# Altium schematic symbol library AD_Lib.SchLib: 1239 symbols (part 8 of 9)
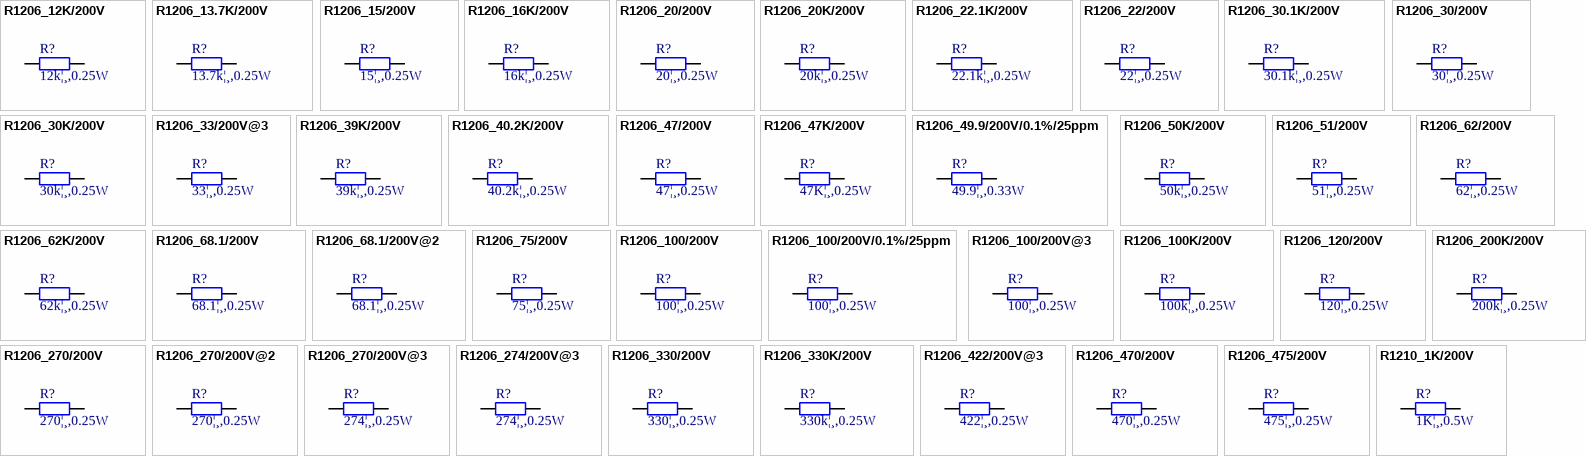
[diagram p49: symbols R1206_12K/200V to R1210_1K/200V]

## R1206_100K/200V
designator R?, comment 100k¦¸,0.25W
ÌùÆ¬µç×è; Manufacturer: KOA; pro-environment: RoHS; Quality: -55~155¡æ; other: 100k¦¸,0.25W,1%,200V; OPN: RK73H2BTTD1003F; PadsNum: 2; SN: SN; Category: µç×è; Part: RK73H2BTTD1003F; Value: 100k¦¸,0.25W; QTY: 5000; Price: ?; OPN_JLC: 1206W4F1003T5E; SN_JLC: C17900; Price_JLC: 0
footprint R1206 (¹«ÖÆ3216£»Ó¢ÖÆ1206£»¹¦ÂÊ1/4W)
pins: 1, 2

## R1206_120/200V
designator R?, comment 120¦¸,0.25W
ÌùÆ¬µç×è; Manufacturer: KOA; pro-environment: RoHS; Quality: -55~155¡æ; other: 120¦¸,0.25W,1%,200V; OPN: RK73H2BTTD1200F; PadsNum: 2; SN: SN; Category: µç×è; Part: RK73H2BTTD1200F; Value: 120¦¸,0.25W; QTY: 5000; Price: 0.04633; OPN_JLC: RC1206FR-07120RL; SN_JLC: C114928; Price_JLC: 0.032654
footprint R1206 (¹«ÖÆ3216£»Ó¢ÖÆ1206£»)
pins: 1, 2

## R1206_200K/200V
designator R?, comment 200k¦¸,0.25W
ÌùÆ¬µç×è; Manufacturer: KOA; pro-environment: RoHS; Quality: -55~155¡æ; other: 200k¦¸,0.25W,1%,200V; OPN: RK73H2BTTD2001F; PadsNum: 2; SN: SN; Category: µç×è; Part: RK73H2BTTD2001F; Value: 200k¦¸,0.25W; QTY: 5000; Price: 0.04563; OPN_JLC: OPN_JLC; SN_JLC: SN_JLC; Price_JLC: 0
footprint R1206 (¹«ÖÆ3216£»Ó¢ÖÆ1206£»¹¦ÂÊ1/4W)
pins: 1, 2

## R1206_270/200V
designator R?, comment 270¦¸,0.25W
ÌùÆ¬µç×è; Manufacturer: KOA; pro-environment: RoHS; Quality: -55~155¡æ; other: 270¦¸,0.25W,1%,200V; OPN: RK73H2BTTD2700F; PadsNum: 2; SN: SN; Category: µç×è; Part: RK73H2BTTD2700F; Value: 270¦¸,0.25W; QTY: 270; Price: ?; OPN_JLC: OPN_JLC; SN_JLC: SN_JLC; Price_JLC: 0
footprint R1206 (¹«ÖÆ3216£»Ó¢ÖÆ1206£»¹¦ÂÊ1/4W)
pins: 1, 2

## R1206_270/200V@2
designator R?, comment 270¦¸,0.25W
ÌùÆ¬µç×è; Manufacturer: Panasonic; pro-environment: RoHS; Quality: -55~155¡æ; other: 270¦¸,0.25W,1%,200V; OPN: ERJ-8ENF2700V; PadsNum: 2; SN: SN; Category: µç×è; Part: ERJ-8ENF2700V; Value: 270¦¸,0.25W; Price: ?; OPN_JLC: OPN_JLC; SN_JLC: SN_JLC; Price_JLC: 0
footprint R1206 (¹«ÖÆ3216£»Ó¢ÖÆ1206£»¹¦ÂÊ1/4W)
pins: 1, 2

## R1206_270/200V@3
designator R?, comment 274¦¸,0.25W
ÌùÆ¬µç×è; Manufacturer: Yageo; pro-environment: RoHS; Quality: -55~155¡æ; other: 274¦¸,0.25W,1%,200V; OPN: RC1206FR-07274R; PadsNum: 2; SN: SN; Category: µç×è; Part: RC1206FR-07274R; Value: 274¦¸,0.25W; QTY: 5000; Price: 0.03042; OPN_JLC: OPN_JLC; SN_JLC: SN_JLC; Price_JLC: 0
footprint R1206 (¹«ÖÆ3216£»Ó¢ÖÆ1206£»¹¦ÂÊ1/4W)
pins: 1, 2

## R1206_274/200V@3
designator R?, comment 274¦¸,0.25W
ÌùÆ¬µç×è; Manufacturer: Yageo; pro-environment: RoHS; Quality: -55~155¡æ; other: 274¦¸,0.25W,1%,200V; OPN: RC1206FR-07274R; PadsNum: 2; SN: SN; Category: µç×è; Part: RC1206FR-07274R; Value: 274¦¸,0.25W; QTY: 5000; Price: ?; OPN_JLC: OPN_JLC; SN_JLC: SN_JLC; Price_JLC: 0
footprint R1206 (¹«ÖÆ3216£»Ó¢ÖÆ1206£»)
pins: 1, 2

## R1206_330/200V
designator R?, comment 330¦¸,0.25W
ÌùÆ¬µç×è; Manufacturer: KOA; pro-environment: RoHS; Quality: -55~155¡æ; other: 330¦¸,0.25W,1%,200V; OPN: RK73H2BTTD3300F; PadsNum: 2; SN: SN; Category: µç×è; Part: RK73H2BTTD3300F; Value: 330¦¸,0.25W; QTY: 5000; Price: ?; OPN_JLC: OPN_JLC; SN_JLC: SN_JLC; Price_JLC: 0
footprint R1206 (¹«ÖÆ3216£»Ó¢ÖÆ1206£»¹¦ÂÊ1/4W)
pins: 1, 2

## R1206_330K/200V
designator R?, comment 330k¦¸,0.25W
ÌùÆ¬µç×è; Manufacturer: KOA; pro-environment: RoHS; Quality: -55~155¡æ; SN: 03.4.38.11.18033402S; other: 330k¦¸,0.25W,1%,200V; OPN: RK73H2BTTD3303F; PadsNum: 2; Category: µç×è; Part: RK73H2BTTD3303F; Value: 330k¦¸,0.25W; QTY: 5000; Price: 0.05031; OPN_JLC: OPN_JLC; SN_JLC: SN_JLC; Price_JLC: 0
footprint R1206 (¹«ÖÆ3216£»Ó¢ÖÆ1206£»¹¦ÂÊ1/4W)
pins: 1, 2

## R1206_422/200V@3
designator R?, comment 422¦¸,0.25W
ÌùÆ¬µç×è; Manufacturer: Yageo; pro-environment: RoHS; Quality: -55~155¡æ; SN: 03.4.38.11.18042101S; other: 422¦¸,0.25W,1%,200V; OPN: RC1206FR-07422RL; PadsNum: 2; Category: µç×è; Part: RC1206FR-07422RL; Value: 422¦¸,0.25W; QTY: 5000; Price: 0.03042; OPN_JLC: OPN_JLC; SN_JLC: SN_JLC; Price_JLC: 0
footprint R1206 (¹«ÖÆ3216£»Ó¢ÖÆ1206£»)
pins: 1, 2

## R1206_470/200V
designator R?, comment 470¦¸,0.25W
ÌùÆ¬µç×è; Manufacturer: KOA; pro-environment: RoHS; Quality: -55~155¡æ; SN: 03.4.38.11.18047103S; other: 470¦¸,0.25W,1%,200V; OPN: RK73H2BTTD4700F; PadsNum: 2; Category: µç×è; Part: RK73H2BTTD4700F; Value: 470¦¸,0.25W; QTY: 5000; Price: ?; OPN_JLC: OPN_JLC; SN_JLC: SN_JLC; Price_JLC: 0
footprint R1206 (¹«ÖÆ3216£»Ó¢ÖÆ1206£»)
pins: 1, 2

## R1206_475/200V
designator R?, comment 475¦¸,0.25W
ÌùÆ¬µç×è; Manufacturer: KOA; pro-environment: RoHS; Quality: -55~155¡æ; other: 475¦¸,0.25W,1%,200V; OPN: RK73H2BTTD4750F; PadsNum: 2; SN: SN; Category: µç×è; Part: RK73H2BTTD4750F; Value: 475¦¸,0.25W; QTY: 5000; Price: ?; OPN_JLC: OPN_JLC; SN_JLC: SN_JLC; Price_JLC: 0
footprint R1206 (¹«ÖÆ3216£»Ó¢ÖÆ1206£»¹¦ÂÊ1/4W)
pins: 1, 2

## R1210_1K/200V
designator R?, comment 1K¦¸,0.5W
ÌùÆ¬µç×è; Manufacturer: KOA; pro-environment: RoHS; Quality: -55~155¡æ; SN: 03.4.38.11.19010201S; other: 1K¦¸,0.5W,5%,200V; OPN: RK73H2ETTD1001F; PadsNum: 2; Category: µç×è; Part: RK73H2ETTD1001F; Value: 1K¦¸,0.5W; QTY: 5000; Price: 0.27495; OPN_JLC: OPN_JLC; SN_JLC: SN_JLC; Price_JLC: 0
footprint R1210 (¹«ÖÆ3225£»Ó¢ÖÆ1210£»¹¦ÂÊ1/3W)
pins: 1, 2

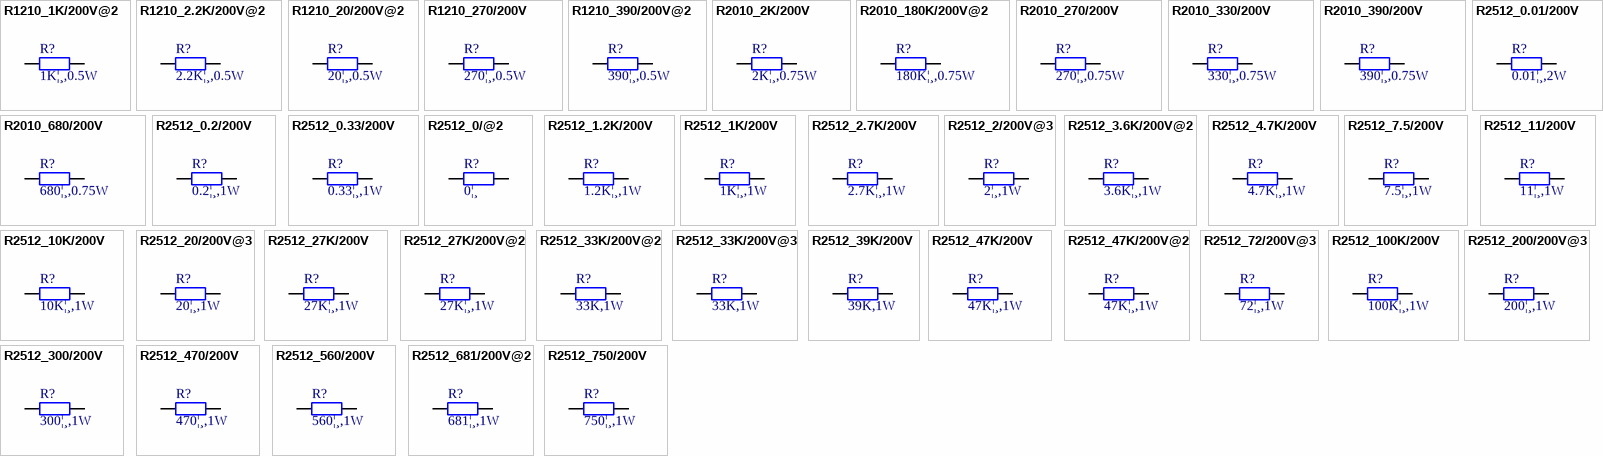
[diagram p35: symbols R1210_1K/200V@2 to R2512_750/200V]

## R1210_1K/200V@2
designator R?, comment 1K¦¸,0.5W
ÌùÆ¬µç×è; Manufacturer: Panasonic; pro-environment: RoHS; Quality: -55~155¡æ; other: 1K¦¸,0.5W,5%,200V; OPN: ERJ14YJ102U; PadsNum: 2; SN: SN; Category: µç×è; Part: ERJ14YJ102U; Value: 1K¦¸,0.5W; QTY: 5000; Price: 0.16965; OPN_JLC: OPN_JLC; SN_JLC: SN_JLC; Price_JLC: 0
footprint R1210 (¹«ÖÆ3225£»Ó¢ÖÆ1210£»¹¦ÂÊ1/3W)
pins: 1, 2

## R1210_2.2K/200V@2
designator R?, comment 2.2K¦¸,0.5W
ÌùÆ¬µç×è; Manufacturer: Panasonic; pro-environment: RoHS; Quality: -55~155¡æ; other: 2.2K¦¸,0.5W,5%,200V; OPN: ERJ-14YJ222U; PadsNum: 2; SN: SN; Category: µç×è; Part: ERJ-14YJ222U; Value: 2.2K¦¸,0.5W; QTY: 5000; Price: 0.16965; OPN_JLC: OPN_JLC; SN_JLC: SN_JLC; Price_JLC: 0
footprint R1210 (¹«ÖÆ3225£»Ó¢ÖÆ1210£»¹¦ÂÊ1/3W)
pins: 1, 2

## R1210_20/200V@2
designator R?, comment 20¦¸,0.5W
ÌùÆ¬µç×è; Manufacturer: Panasonic; pro-environment: RoHS; Quality: -55~155¡æ; other: 20¦¸,0.5W,5%,200V; OPN: ERJ14YJ200U; PadsNum: 2; SN: SN; Category: µç×è; Part: ERJ14YJ200U; Value: 20¦¸,0.5W; QTY: 5000; Price: 0.16965; OPN_JLC: OPN_JLC; SN_JLC: SN_JLC; Price_JLC: 0
footprint R1210 (¹«ÖÆ3225£»Ó¢ÖÆ1210£»¹¦ÂÊ1/3W)
pins: 1, 2

## R1210_270/200V
designator R?, comment 270¦¸,0.5W
ÌùÆ¬µç×è; Manufacturer: KOA; pro-environment: RoHS; Quality: -55~155¡æ; SN: 03.4.38.11.19027201S; other: 270¦¸,0.5W,5%,200V; OPN: RK73H2ETTD2700F; PadsNum: 2; Category: µç×è; Part: RK73H2ETTD2700F; Value: 270¦¸,0.5W; QTY: 5000; Price: 0.27495; OPN_JLC: OPN_JLC; SN_JLC: SN_JLC; Price_JLC: 0
footprint R1210 (¹«ÖÆ3225£»Ó¢ÖÆ1210£»¹¦ÂÊ1/3W)
pins: 1, 2

## R1210_390/200V@2
designator R?, comment 390¦¸,0.5W
ÌùÆ¬µç×è; Manufacturer: Panasonic; pro-environment: RoHS; Quality: -55~155¡æ; other: 390¦¸,0.5W,5%,200V; OPN: ERJ14YJ391U; PadsNum: 2; SN: SN; Category: µç×è; Part: ERJ14YJ391U; Value: 390¦¸,0.5W; QTY: 5000; Price: 0.16965; OPN_JLC: OPN_JLC; SN_JLC: SN_JLC; Price_JLC: 0
footprint R1210 (¹«ÖÆ3225£»Ó¢ÖÆ1210£»¹¦ÂÊ1/3W)
pins: 1, 2

## R2010_2K/200V
designator R?, comment 2K¦¸,0.75W
ÌùÆ¬µç×è; Manufacturer: KOA; pro-environment: RoHS; Quality: -55~155¡æ; other: 2K¦¸,0.75W,1%,200V; OPN: RK73HW2HTTE2001F; PadsNum: 2; SN: SN; Category: µç×è; Part: RK73HW2HTTE2001F; Value: 2K¦¸,0.75W; QTY: 4000; Price: 1.2051; OPN_JLC: OPN_JLC; SN_JLC: SN_JLC; Price_JLC: 0
footprint R2010 (Chip Resistor; Body 5.0 x 2.5 mm (LxW typ))
pins: 1, 2

## R2010_180K/200V@2
designator R?, comment 180K¦¸,0.75W
ÌùÆ¬µç×è; Manufacturer: Panasonic; pro-environment: RoHS; Quality: -55~155¡æ; other: 180K¦¸,0.75W,1%,200V; OPN: ERJ12YJ184U; PadsNum: 2; SN: SN; Category: µç×è; Part: ERJ12YJ184U; Value: 180K¦¸,0.75W; QTY: 4000; OPN_JLC: OPN_JLC; SN_JLC: SN_JLC; Price_JLC: 0
footprint R2010 (Chip Resistor; Body 5.0 x 2.5 mm (LxW typ))
pins: 1, 2

## R2010_270/200V
designator R?, comment 270¦¸,0.75W
ÌùÆ¬µç×è; Manufacturer: KOA; pro-environment: RoHS; Quality: -55~155¡æ; other: 270¦¸,0.75W,1%,200V; OPN: RK73HW2HTTE2700F; PadsNum: 2; SN: SN; Category: µç×è; Part: RK73HW2HTTE2700F; Value: 270¦¸,0.75W; QTY: 4000; OPN_JLC: OPN_JLC; SN_JLC: SN_JLC; Price_JLC: 0
footprint R2010 (Chip Resistor; Body 5.0 x 2.5 mm (LxW typ))
pins: 1, 2

## R2010_330/200V
designator R?, comment 330¦¸,0.75W
ÌùÆ¬µç×è; Manufacturer: KOA; pro-environment: RoHS; Quality: -55~155¡æ; other: 330¦¸,0.75W,1%,200V; OPN: RK73HW2HTTE3300F; PadsNum: 2; SN: SN; Category: µç×è; Part: RK73HW2HTTE3300F; Value: 330¦¸,0.75W; QTY: 4000; OPN_JLC: OPN_JLC; SN_JLC: SN_JLC; Price_JLC: 0
footprint R2010 (Chip Resistor; Body 5.0 x 2.5 mm (LxW typ))
pins: 1, 2

## R2010_390/200V
designator R?, comment 390¦¸,0.75W
ÌùÆ¬µç×è; Manufacturer: KOA; pro-environment: RoHS; Quality: -55~155¡æ; other: 390¦¸,0.75W,1%,200V; OPN: RK73HW2HRTTE3900F; PadsNum: 2; SN: SN; Category: µç×è; Part: RK73HW2HRTTE3900F; Value: 390¦¸,0.75W; QTY: 4000; Price: 1.2051; OPN_JLC: OPN_JLC; SN_JLC: SN_JLC; Price_JLC: 0
footprint R2010 (Chip Resistor; Body 5.0 x 2.5 mm (LxW typ))
pins: 1, 2

## R2010_680/200V
designator R?, comment 680¦¸,0.75W
ÌùÆ¬µç×è; Manufacturer: KOA; Part: 'RK73HW2HTTE6800F; pro-environment: RoHS; Quality: -55~155¡æ; other: 680¦¸,0.75W,1%,200V; OPN: RK73HW2HTTE6800F; PadsNum: 2; SN: SN; Category: µç×è; Value: 680¦¸,0.75W; QTY: 4000; OPN_JLC: OPN_JLC; SN_JLC: SN_JLC; Price_JLC: 0
footprint R2010 (Chip Resistor; Body 5.0 x 2.5 mm (LxW typ))
pins: 1, 2

## R2512_0.01/200V
designator R?, comment 0.01¦¸,2W
ÌùÆ¬µç×è£¬µçÁ÷²ÉÑù; Manufacturer: KOA; pro-environment: RoHS; Quality: -65~170¡æ; other: 0.01¦¸,1W,1%,200V,150ppm; OPN: TLR3AWDTE10L0F; PadsNum: 2; SN: SN; Category: µç×è; Part: TLR3AWDTE10L0F; Value: 0.01¦¸,2W; QTY: 2000; Price: 4.3056; OPN_JLC: OPN_JLC; SN_JLC: SN_JLC; Price_JLC: 0
footprint R2512 (¹«ÖÆ6432£»Ó¢ÖÆ2512£»¹¦ÂÊ1W)
pins: 1, 2

## R2512_0.2/200V
designator R?, comment 0.2¦¸,1W
ÌùÆ¬µç×è£¬µçÁ÷²ÉÑù; Manufacturer: KOA; pro-environment: RoHS; Quality: -55~180¡æ; other: 0.2¦¸,1W,1%,200V,100ppm; OPN: SL1TTER200F; PadsNum: 2; SN: SN; Category: µç×è; Part: SL1TTER200F; Value: 0.2¦¸,1W; QTY: 1000; Price: 3.5568; OPN_JLC: OPN_JLC; SN_JLC: SN_JLC; Price_JLC: 0
footprint R2512 (¹«ÖÆ6432£»Ó¢ÖÆ2512£»¹¦ÂÊ1W)
pins: 1, 2

## R2512_0.33/200V
designator R?, comment 0.33¦¸,1W
ÌùÆ¬µç×è£¬µçÁ÷²ÉÑù; Manufacturer: Yageo; pro-environment: RoHS; Quality: -55~125¡æ; SN: 03.4.38.11.22033001S; other: 0.33¦¸,1W,1%,200V,800ppm; OPN: RL2512FK-070R33L; PadsNum: 2; Category: µç×è; Part: RL2512FK-070R33L; Value: 0.33¦¸,1W; QTY: 4000; Price: 0.70317; OPN_JLC: OPN_JLC; SN_JLC: SN_JLC; Price_JLC: 0
footprint R2512 (¹«ÖÆ6432£»Ó¢ÖÆ2512£»¹¦ÂÊ1W)
pins: 1, 2

## R2512_0/@2
designator R?, comment 0¦¸
ÌùÆ¬µç×è; Manufacturer: Panasonic; pro-environment: RoHS; Quality: -55~155¡æ; SN: 03.4.38.11.22000001S; other: 0¦¸,1W,0.05%; OPN: ERJ1TY0R00U; PadsNum: 2; Category: µç×è; Part: ERJ1TY0R00U; Value: 0¦¸; QTY: 4000; Price: 0.46917; OPN_JLC: OPN_JLC; SN_JLC: SN_JLC; Price_JLC: 0
footprint R2512 (¹«ÖÆ6432£»Ó¢ÖÆ2512£»¹¦ÂÊ1W)
pins: 1, 2

## R2512_1.2K/200V
designator R?, comment 1.2K¦¸,1W
ÌùÆ¬µç×è; Manufacturer: KOA; pro-environment: RoHS; Quality: -55~155¡æ; other: 1.2K¦¸,1W,1%,200V; OPN: RK73HW3ATTE1201F; PadsNum: 2; SN: SN; Category: µç×è; Part: RK73HW3ATTE1201F; Value: 1.2K¦¸,1W; QTY: 4000; OPN_JLC: OPN_JLC; SN_JLC: SN_JLC; Price_JLC: 0
footprint R2512 (¹«ÖÆ6432£»Ó¢ÖÆ2512£»¹¦ÂÊ1W)
pins: 1, 2

## R2512_1K/200V
designator R?, comment 1K¦¸,1W
ÌùÆ¬µç×è; Manufacturer: KOA; pro-environment: RoHS; Quality: -55~155¡æ; other: 1K¦¸,1W,1%,200V; OPN: RK73HW3ATTE1001F; PadsNum: 2; SN: SN; Category: µç×è; Part: RK73HW3ATTE1001F; Value: 1K¦¸,1W; QTY: 4000; OPN_JLC: OPN_JLC; SN_JLC: SN_JLC; Price_JLC: 0
footprint R2512 (¹«ÖÆ6432£»Ó¢ÖÆ2512£»¹¦ÂÊ1W)
pins: 1, 2

## R2512_2.7K/200V
designator R?, comment 2.7K¦¸,1W
ÌùÆ¬µç×è; Manufacturer: KOA; pro-environment: RoHS; Quality: -55~155¡æ; other: 2.7K¦¸,1W,1%,200V; OPN: RK73HW3ARTTE2701F; PadsNum: 2; SN: SN; Category: µç×è; Part: RK73HW3ARTTE2701F; Value: 2.7K¦¸,1W; QTY: 4000; Price: 1.9656; OPN_JLC: OPN_JLC; SN_JLC: SN_JLC; Price_JLC: 0
footprint R2512 (¹«ÖÆ6432£»Ó¢ÖÆ2512£»¹¦ÂÊ1W)
pins: 1, 2

## R2512_2/200V@3
designator R?, comment 2¦¸,1W
ÌùÆ¬µç×è; Manufacturer: Yageo; pro-environment: RoHS; Quality: -55~155¡æ; other: 2¦¸,1W,5%,200V; OPN: RC2512JK-072RL; PadsNum: 2; SN: SN; Category: µç×è; Part: RC2512JK-072RL; Value: 2¦¸,1W; QTY: 4000; Price: 0.16146; OPN_JLC: OPN_JLC; SN_JLC: SN_JLC; Price_JLC: 0
footprint R2512 (¹«ÖÆ6432£»Ó¢ÖÆ2512£»¹¦ÂÊ1W)
pins: 1, 2

## R2512_3.6K/200V@2
designator R?, comment 3.6K¦¸,1W
ÌùÆ¬µç×è; Manufacturer: Panasonic; pro-environment: RoHS; Quality: -55~155¡æ; SN: 03.4.38.11.22036201S; other: 3.6K¦¸,1W,5%,200V; OPN: ERJ1TYJ362U; PadsNum: 2; Category: µç×è; Part: ERJ1TYJ362U; Value: 3.6K¦¸,1W; QTY: 4000; Price: 0.51714; OPN_JLC: OPN_JLC; SN_JLC: SN_JLC; Price_JLC: 0
footprint R2512 (¹«ÖÆ6432£»Ó¢ÖÆ2512£»¹¦ÂÊ1W)
pins: 1, 2

## R2512_4.7K/200V
designator R?, comment 4.7K¦¸,1W
ÌùÆ¬µç×è; Manufacturer: KOA; pro-environment: RoHS; Quality: -55~155¡æ; other: 4.7K¦¸,1W,1%,200V; OPN: RK73HW3ATTE4701F; PadsNum: 2; SN: SN; Category: µç×è; Part: RK73HW3ATTE4701F; Value: 4.7K¦¸,1W; QTY: 4000; OPN_JLC: OPN_JLC; SN_JLC: SN_JLC; Price_JLC: 0
footprint R2512 (¹«ÖÆ6432£»Ó¢ÖÆ2512£»¹¦ÂÊ1W)
pins: 1, 2

## R2512_7.5/200V
designator R?, comment 7.5¦¸,1W
ÌùÆ¬µç×è; Manufacturer: KOA; pro-environment: RoHS; Quality: -55~155¡æ; other: 7.5¦¸,1W,1%,200V; OPN: RK73HW3ATTED7R5F; PadsNum: 2; SN: SN; Category: µç×è; Part: RK73HW3ATTED7R5F; Value: 7.5¦¸,1W; QTY: 4000; Price: ?; OPN_JLC: OPN_JLC; SN_JLC: SN_JLC; Price_JLC: 0
footprint R2512 (¹«ÖÆ6432£»Ó¢ÖÆ2512£»¹¦ÂÊ1W)
pins: 1, 2

## R2512_10K/200V
designator R?, comment 10K¦¸,1W
ÌùÆ¬µç×è; Manufacturer: KOA; pro-environment: RoHS; Quality: -55~155¡æ; other: 10K¦¸,1W,1%,200V; OPN: RK73H3ATTE1002F; PadsNum: 2; SN: SN; Category: µç×è; Part: RK73H3ATTE1002F; Value: 10K¦¸,1W; QTY: 4000; Price: 0.57798; OPN_JLC: OPN_JLC; SN_JLC: SN_JLC; Price_JLC: 0
footprint R2512 (¹«ÖÆ6432£»Ó¢ÖÆ2512£»¹¦ÂÊ1W)
pins: 1, 2

## R2512_11/200V
designator R?, comment 11¦¸,1W
ÌùÆ¬µç×è; Manufacturer: KOA; pro-environment: RoHS; Quality: -55~155¡æ; other: 11¦¸,1W,1%,200V; OPN: RK73HW3ARTTE11R0F; PadsNum: 2; SN: SN; Category: µç×è; Part: RK73HW3ARTTE11R0F; Value: 11¦¸,1W; QTY: 4000; Price: 2.3517; OPN_JLC: OPN_JLC; SN_JLC: SN_JLC; Price_JLC: 0
footprint R2512 (¹«ÖÆ6432£»Ó¢ÖÆ2512£»¹¦ÂÊ1W)
pins: 1, 2

## R2512_20/200V@3
designator R?, comment 20¦¸,1W
ÌùÆ¬µç×è; Manufacturer: Yageo; pro-environment: RoHS; Quality: -55~155¡æ; other: 20¦¸,1W,5%,200V; OPN: RC2512JK-0720RL; PadsNum: 2; SN: SN; Category: µç×è; Part: RC2512JK-0720RL; Value: 20¦¸,1W; QTY: 4000; Price: 0.27729; OPN_JLC: OPN_JLC; SN_JLC: SN_JLC; Price_JLC: 0
footprint R2512 (¹«ÖÆ6432£»Ó¢ÖÆ2512£»¹¦ÂÊ1W)
pins: 1, 2

## R2512_27K/200V
designator R?, comment 27K¦¸,1W
ÌùÆ¬µç×è; Manufacturer: KOA; pro-environment: RoHS; Quality: -55~155¡æ; SN: 03.4.38.11.22027302S; other: 27K¦¸,1W,5%,200V; OPN: RK73HW3ATTE2702F; PadsNum: 2; Category: µç×è; Part: RK73HW3ATTE2702F; Value: 27K¦¸,1W; QTY: 4000; Price: ?; OPN_JLC: OPN_JLC; SN_JLC: SN_JLC; Price_JLC: 0
footprint R2512 (¹«ÖÆ6432£»Ó¢ÖÆ2512£»¹¦ÂÊ1W)
pins: 1, 2

## R2512_27K/200V@2
designator R?, comment 27K¦¸,1W
ÌùÆ¬µç×è; Manufacturer: Panasonic; pro-environment: RoHS; Quality: -55~155¡æ; other: 27K¦¸,1W,5%,200V; OPN: ERJ-1TYJ273U; PadsNum: 2; SN: SN; Category: µç×è; Part: ERJ-1TYJ273U; Value: 27K¦¸,1W; QTY: 4000; Price: 0.66222; OPN_JLC: OPN_JLC; SN_JLC: SN_JLC; Price_JLC: 0
footprint R2512 (¹«ÖÆ6432£»Ó¢ÖÆ2512£»¹¦ÂÊ1W)
pins: 1, 2

## R2512_33K/200V@2
designator R?, comment 33K,1W
ÌùÆ¬µç×è; Manufacturer: Panasonic; pro-environment: RoHS; Quality: -55~155¡æ; SN: 03.4.38.11.22033301S; other: 33K,1W,5%,200V; OPN: ERJ1TYJ333U; PadsNum: 2; Category: µç×è; Part: ERJ1TYJ333U; Value: 33K,1W; QTY: 4000; Price: 0.69498; OPN_JLC: OPN_JLC; SN_JLC: SN_JLC; Price_JLC: 0
footprint R2512 (¹«ÖÆ6432£»Ó¢ÖÆ2512£»¹¦ÂÊ1W)
pins: 1, 2

## R2512_33K/200V@3
designator R?, comment 33K,1W
ÌùÆ¬µç×è; Manufacturer: Yageo; pro-environment: RoHS; Quality: -55~155¡æ; SN: 03.4.38.11.22033303S; other: 33K,1W,5%,200V; OPN: RC2512FK-0733KL; PadsNum: 2; Category: µç×è; Part: RC2512FK-0733KL; Value: 33K,1W; QTY: 4000; Price: 0.29133; OPN_JLC: OPN_JLC; SN_JLC: SN_JLC; Price_JLC: 0
footprint R2512 (¹«ÖÆ6432£»Ó¢ÖÆ2512£»¹¦ÂÊ1W)
pins: 1, 2

## R2512_39K/200V
designator R?, comment 39K,1W
ÌùÆ¬µç×è; Manufacturer: KOA; pro-environment: RoHS; Quality: -55~155¡æ; other: 39K,1W,5%,200V; OPN: RK73HW3ATTE3902F; PadsNum: 2; SN: SN; Category: µç×è; Part: RK73HW3ATTE3902F; Value: 39K,1W; QTY: 4000; Price: ?; OPN_JLC: OPN_JLC; SN_JLC: SN_JLC; Price_JLC: 0
footprint R2512 (¹«ÖÆ6432£»Ó¢ÖÆ2512£»¹¦ÂÊ1W)
pins: 1, 2

## R2512_47K/200V
designator R?, comment 47K¦¸,1W
ÌùÆ¬µç×è; Manufacturer: KOA; pro-environment: RoHS; Quality: -55~155¡æ; other: 47K¦¸,1W,1%,200V; OPN: RK73HW3ARTTE4702F; PadsNum: 2; SN: SN; Category: µç×è; Part: RK73HW3ARTTE4702F; Value: 47K¦¸,1W; QTY: 4000; Price: 1.9656; OPN_JLC: OPN_JLC; SN_JLC: SN_JLC; Price_JLC: 0
footprint R2512 (¹«ÖÆ6432£»Ó¢ÖÆ2512£»¹¦ÂÊ1W)
pins: 1, 2

## R2512_47K/200V@2
designator R?, comment 47K¦¸,1W
ÌùÆ¬µç×è; Manufacturer: Panasonic; pro-environment: RoHS; Quality: -55~155¡æ; SN: 03.4.38.11.22047301S; other: 47K¦¸,1W,1%,200V; OPN: ERJ1TYJ473U; PadsNum: 2; Category: µç×è; Part: ERJ1TYJ473U; Value: 47K¦¸,1W; QTY: 4000; Price: 0.51714; OPN_JLC: OPN_JLC; SN_JLC: SN_JLC; Price_JLC: 0
footprint R2512 (¹«ÖÆ6432£»Ó¢ÖÆ2512£»¹¦ÂÊ1W)
pins: 1, 2

## R2512_72/200V@3
designator R?, comment 72¦¸,1W
ÌùÆ¬µç×è; Manufacturer: Yageo; pro-environment: RoHS; Quality: -55~155¡æ; other: 72¦¸,1W,5%,200V; OPN: RC2512JK-072RL; PadsNum: 2; SN: SN; Category: µç×è; Part: RC2512JK-072RL; Value: 72¦¸,1W; Price: ?; OPN_JLC: OPN_JLC; SN_JLC: SN_JLC; Price_JLC: 0
footprint R2512 (¹«ÖÆ6432£»Ó¢ÖÆ2512£»¹¦ÂÊ1W)
pins: 1, 2

## R2512_100K/200V
designator R?, comment 100K¦¸,1W
ÌùÆ¬µç×è; Manufacturer: KOA; pro-environment: RoHS; Quality: -55~155¡æ; other: 100K¦¸,1W,5%,200V; OPN: RK73HW3ATTE1003F; PadsNum: 2; SN: SN; Category: µç×è; Part: RK73HW3ATTE1003F; Value: 100K¦¸,1W; QTY: 4000; Price: 0.57798; OPN_JLC: OPN_JLC; SN_JLC: SN_JLC; Price_JLC: 0
footprint R2512 (¹«ÖÆ6432£»Ó¢ÖÆ2512£»¹¦ÂÊ1W)
pins: 1, 2

## R2512_200/200V@3
designator R?, comment 200¦¸,1W
ÌùÆ¬µç×è; Manufacturer: Yageo; pro-environment: RoHS; Quality: -55~155¡æ; other: 200¦¸,1W,5%,200V; OPN: RC2512JK-07200RL; PadsNum: 2; SN: SN; Category: µç×è; Part: RC2512JK-07200RL; Value: 200¦¸,1W; QTY: 4000; Price: ?; OPN_JLC: OPN_JLC; SN_JLC: SN_JLC; Price_JLC: 0
footprint R2512 (¹«ÖÆ6432£»Ó¢ÖÆ2512£»¹¦ÂÊ1W)
pins: 1, 2

## R2512_300/200V
designator R?, comment 300¦¸,1W
ÌùÆ¬µç×è; Manufacturer: KOA; pro-environment: RoHS; Quality: -55~155¡æ; other: 300¦¸,1W,1%,200V; OPN: RK73HW3ATTE3000F; PadsNum: 2; SN: SN; Category: µç×è; Part: RK73HW3ATTE3000F; Value: 300¦¸,1W; QTY: 4000; OPN_JLC: OPN_JLC; SN_JLC: SN_JLC; Price_JLC: 0
footprint R2512 (¹«ÖÆ6432£»Ó¢ÖÆ2512£»¹¦ÂÊ1W)
pins: 1, 2
